# Altium footprint library PcbLibLafe.PcbLib: 294 footprints (part 11 of 19)
Each footprint in its own frame and in the unit in brackets; x right, y up, seen from the top. Pads: shape width x height; smd on the part's side, far side on the other; paste and mask are expansions set on the pad; w line width, h text height; cw(c..) or ccw(c..) is an arc to the next point about the centre after c.
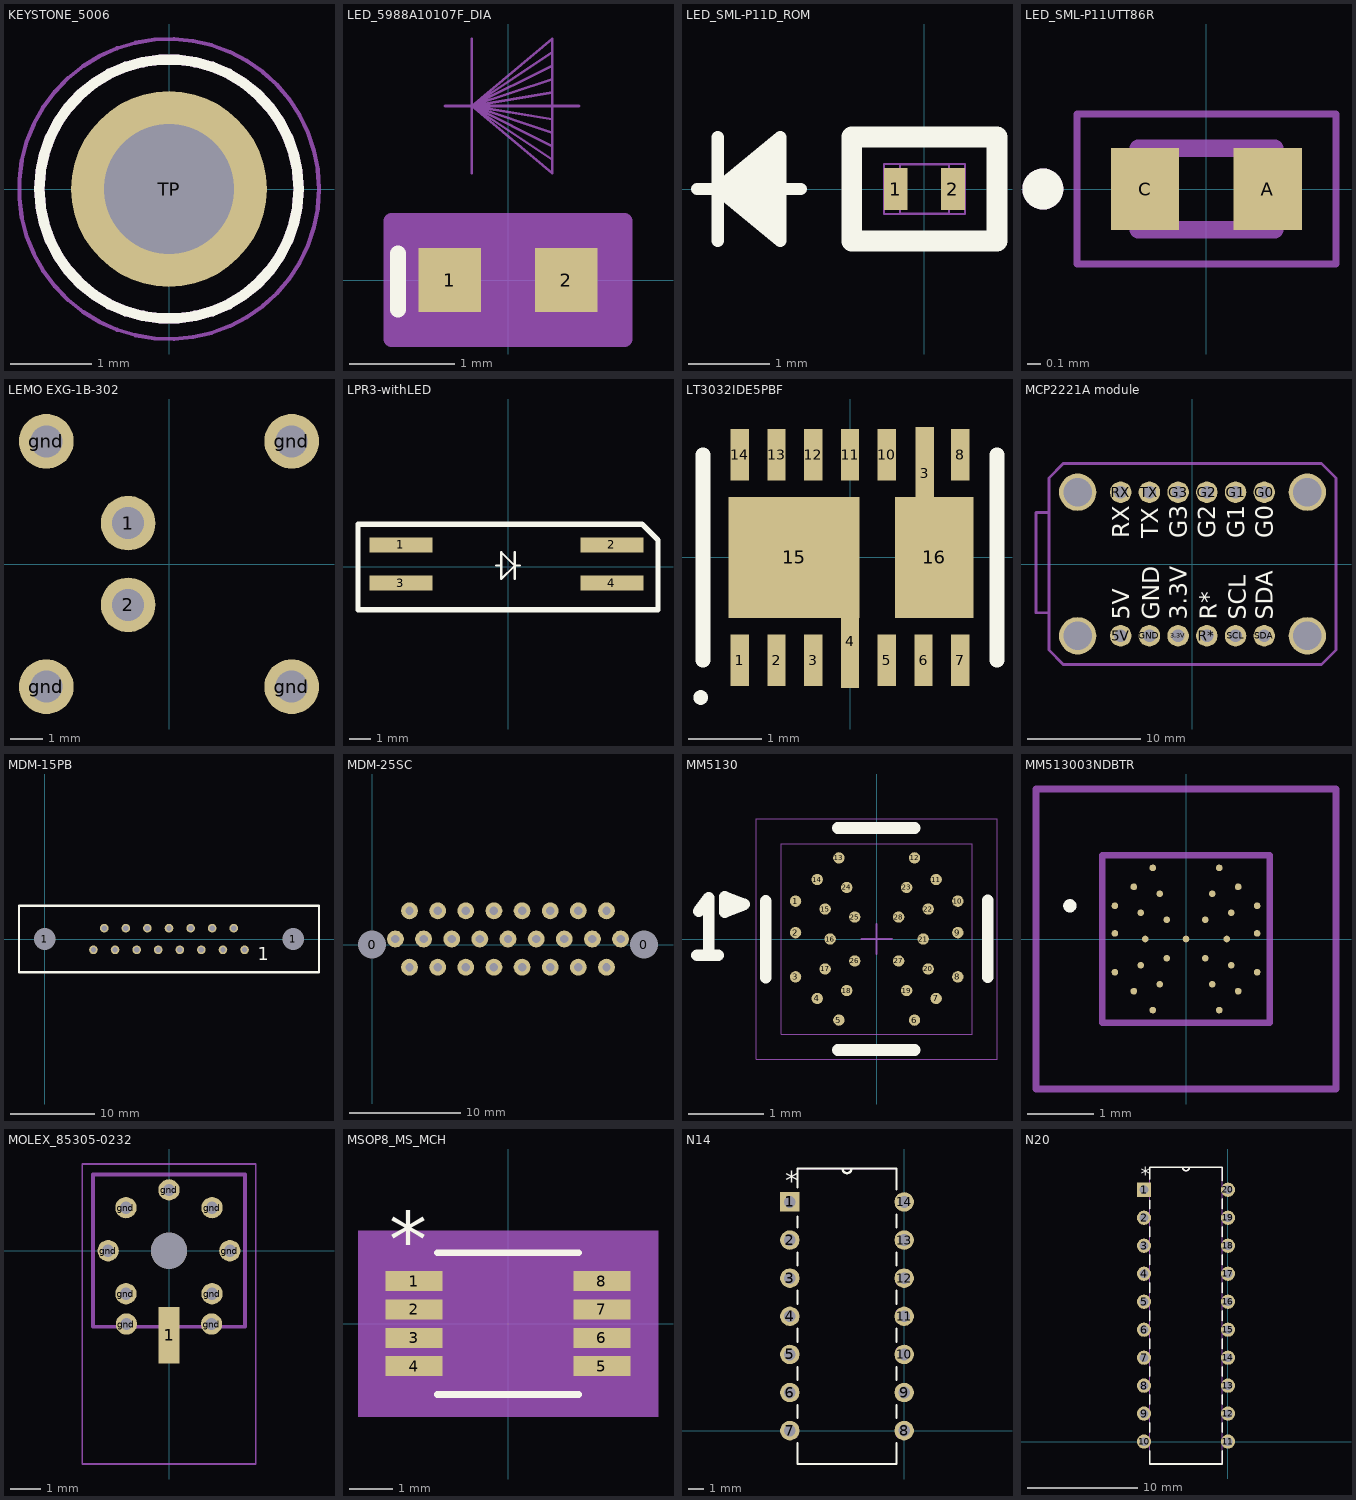
[diagram p10: the footprints below, top view; thin cyan lines are the x and y axes]

## KEYSTONE_5006 [mm]
pads (1):
  round 2.4 hole 1.6: TP(0,0)
Top Overlay:
  circle w0.127: c0,0 r1.59
Mechanical 13:
  circle w0.127: c0,0 r1.59
Mechanical 15:
  circle w0.05: c0,0 r1.84
3D body "step_temp.STEP": height 5.58, standoff -3.3, extent -1.576,-1.587 1.576,1.587

## LED_5988A10107F_DIA [mil]
pads (2):
  rect 23.5x24 smd paste+0 mask+0: 1(-21.75,0) 2(21.75,0)
Top Overlay:
  lines w6: -41,-11 -41,10
Mechanical 13:
  lines w1: -23.5,65 26.5,65 ; -13.5,40 -13.5,90 ; 16.5,45 -13.5,65 ; 16.5,50 -13.5,65 ; 16.5,55 -13.5,65 ; 16.5,60 -13.5,65 ; 16.5,70 -13.5,65 ; 16.5,75 -13.5,65 ; 16.5,80 -13.5,65 ; 16.5,85 -13.5,65 ; -13.5,65 16.5,40 16.5,90 -13.5,65 ; -19.5,-10 -19.5,10 19.5,10 19.5,-10 -19.5,-10
Mechanical 15:
  region: -29.5,-22 -43.5,-22 -43.5,22 -29.5,22 29.5,22 43.5,22 43.5,-22 29.5,-22
  lines w6: -43.5,-22 -29.5,-22 29.5,-22 43.5,-22 43.5,22 29.5,22 -29.5,22 -43.5,22 -43.5,-22
3D body "LED_5988A10107F_DIA.step": height 16.1, standoff -0.12, extent -19.49,-10.12 19.49,10.12

## LED_SML-P11D_ROM [mil]
pads (2):
  rect 11.5x20 smd paste+0 mask+0: 1(-13.75,0) 2(13.75,0)
Top Overlay:
  lines w6: -109.5,0 -59.5,0 ; -99.5,-25 -99.5,25 ; -69.5,-20 -99.5,0 ; -69.5,-15 -99.5,0 ; -69.5,-10 -99.5,0 ; -69.5,-5 -99.5,0 ; -69.5,5 -99.5,0 ; -69.5,10 -99.5,0 ; -69.5,15 -99.5,0 ; -69.5,20 -99.5,0 ; -99.5,0 -69.5,-25 -69.5,25 -99.5,0
  lines w10: -35,-25 35,-25 35,25 -35,25 -35,-25
Mechanical 13:
  lines w1: -109.5,0 -59.5,0 ; -99.5,-25 -99.5,25 ; -69.5,-20 -99.5,0 ; -69.5,-15 -99.5,0 ; -69.5,-10 -99.5,0 ; -69.5,-5 -99.5,0 ; -69.5,5 -99.5,0 ; -69.5,10 -99.5,0 ; -69.5,15 -99.5,0 ; -69.5,20 -99.5,0 ; -99.5,0 -69.5,-25 -69.5,25 -99.5,0 ; -19.5,-12 -19.5,12 19.5,12 19.5,-12 -19.5,-12 ; -11.81,-11.81 11.81,-11.81 11.81,11.81 -11.81,11.81 -11.81,-11.81
3D body: height 10, standoff 0, extent 0,0 10,10

## LED_SML-P11UTT86R [mm]
pads (2):
  rect 0.5x0.6 smd: A(0.45,0) C(-0.45,0)
Top Overlay:
  circle w0.2: c-1.2,0 r0.05
Mechanical 13:
  circle w0.2: c-1.2,0 r0.05
  lines w0.127: -0.5,-0.3 -0.5,0.3 0.5,0.3 0.5,-0.3 -0.5,-0.3
Mechanical 15:
  lines w0.05: -0.95,-0.55 -0.95,0.55 0.95,0.55 0.95,-0.55 -0.95,-0.55
3D body "step_temp.STEP": height 0.21, standoff -0.04, extent -0.5,-0.3 0.5,0.3

## LEMO EXG-1B-302 [mm] "2 pin LEMO right angle panel mount"
pads (6):
  round 1.7 hole 1: 1(-1.27,1.27) 2(-1.27,-1.27) gnd(-3.81,-3.81) gnd(-3.81,3.81) gnd(3.81,-3.81) gnd(3.81,3.81)

## LPR3-withLED [mil] "Bivar lightpipe integrated LED"
pads (4):
  rect 118x28 smd: 1(-200,41) 2(194,41) 3(-200,-30) 4(194,-30)
Top Overlay:
  lines w4: 12.5,-22.5 12.5,2.5 ; 12.5,27.5 12.5,2.5 ; 22.5,2.5 12.5,2.5 ; -12.5,2.5 -12.5,-22.5 12.5,2.5 ; -12.5,2.5 -22.5,2.5 -12.5,2.5 ; -12.5,2.5 -12.5,27.5 12.5,2.5
  lines w10: -280,-80 280,-80 280,50 250,80 -280,80 -280,-80

## LT3032IDE5PBF [mm]
pads (16):
  rect 0.25x0.7 smd: 1(-1.5,-1.4) 2(-1,-1.4) 3(-0.5,-1.4) 5(0.5,-1.4) 6(1,-1.4) 7(1.5,-1.4) 8(1.5,1.4) 10(0.5,1.4) 11(0,1.4) 12(-0.5,1.4) 13(-1,1.4) 14(-1.5,1.4)
  rect 0.25x1.27 smd: 3(1.016,1.143) 4(0,-1.143)
  rect 1.78x1.65 smd: 15(-0.762,0)
  rect 1.07x1.65 smd: 16(1.145,0)
Top Overlay:
  lines w0.1: -2.032,-1.955 ccw(c-2.032,-1.905) -2.032,-1.855 ccw(c-2.032,-1.905) -2.032,-1.955
  lines w0.2: -2,-1.4 -2,1.4 ; 2,-1.4 2,1.4
3D body "LT3032IDE-5#PBF.stp": height 0.9, standoff 0, extent -2,-1.5 2,1.5

## MCP2221A module [mil] "Adafruit MCP2221A"
pads (16):
  round 75 hole 45: 3.3V(-50,-250) 5V(-250,-250) G0(250,250) G1(150,250) G2(50,250) G3(-50,250) GND(-150,-250) R*(50,-250) RX(-250,250) SCL(150,-250) SDA(250,-250) TX(-150,250)
  round 130 hole 100: ""(-400,-250) ""(-400,250) ""(400,-250) ""(400,250)
Top Overlay:
  text "SDA" at 280,-195 h60
  text "SCL" at 185,-195 h60
  text "R*" at 85,-195 h60
  text "3.3V" at -20,-195 h60
  text "GND" at -115,-195 h60
  text "5V" at -220,-195 h60
  text "G0" at 280,90 h60
  text "G1" at 180,90 h60
  text "G2" at 80,90 h60
  text "G3" at -20,90 h60
  text "TX" at -120,90 h60
  text "RX" at -220,90 h60
Mechanical 2:
  lines w10: -500,-170 -545,-170 -545,180 -500,180 ; -500,-300 -500,300 -450,350 450,350 500,300 500,-300 450,-350 -450,-350 -500,-300

## MDM-15PB [mil] "MicroD-15 pin"
pads (17):
  round 60 hole 100: 1(0,0) 1(1150,0)
  round 40 hole 25: ""(225,-50) ""(275,50) ""(325,-50) ""(375,50) ""(425,-50) ""(475,50) ""(525,-50) ""(575,50) ""(625,-50) ""(675,50) ""(725,-50) ""(775,50) ""(825,-50) ""(875,50) ""(925,-50)
Top Overlay:
  lines w10: -120,-154 1270,-154 1270,154 -120,154 -120,-154
  text "1" at 987,-98 h60

## MDM-25SC [mil] "MicroD 25 pin female socket"
pads (27):
  round 60 hole 100: 0(0,0) 0(966,0)
  round 60 hole 30: ""(83,20) ""(133,-80) ""(133,120) ""(183,20) ""(233,-80) ""(233,120) ""(283,20) ""(333,-80) ""(333,120) ""(383,20) ""(433,-80) ""(433,120) ""(483,20) ""(533,-80) ""(533,120) ""(583,20) ""(633,-80) ""(633,120) ""(683,20) ""(733,-80) ""(733,120) ""(783,20) ""(833,-80) ""(833,120) ""(883,20)

## MM5130 [mm] "Standard MM5130 Footprint"
height 1
pads (28):
  round 0.15 smd paste+0 mask+0.025: 1(-1.072,0.5) 2(-1.072,0.084) 3(-1.072,-0.5) 4(-0.786,-0.786) 5(-0.5,-1.072) 6(0.5,-1.072) 7(0.786,-0.786) 8(1.072,-0.5) 9(1.072,0.084) 10(1.072,0.5) 11(0.786,0.786) 12(0.5,1.072) 13(-0.5,1.072) 14(-0.786,0.786) 15(-0.681,0.396) 16(-0.615,0) 17(-0.681,-0.396) 18(-0.396,-0.681) 19(0.396,-0.681) 20(0.681,-0.396) 21(0.615,0) 22(0.681,0.396) 23(0.396,0.681) 24(-0.396,0.681) 25(-0.29,0.29) 26(-0.29,-0.29) 27(0.29,-0.29) 28(0.29,0.29)
Top Overlay:
  lines w0.152: -2.349,0.368 -2.222,0.546 -2.222,-0.216 -2.375,-0.216 -2.095,-0.216 ; -1.467,-0.514 -1.467,0.502 ; -0.514,-1.467 0.502,-1.467 ; -0.514,1.467 0.502,1.467 ; 1.467,-0.504 1.467,0.512 ; -2.007,0.356 -1.753,0.457 -2.007,0.559 -2.007,0.356
Top Courtyard:
  lines w0.01: -1.59,-1.59 1.59,-1.59 1.59,1.59 -1.59,1.59 -1.59,-1.59
Top Component Center:
  lines w0.025: -0.2,0 0.2,0 ; 0,-0.2 0,0.2
Mechanical 16:
  text "G1" at -1.16,0.162 h0.07
  text "RF1" at -0.881,0.858 h0.07
  text "G2" at -0.709,0.091 h0.07
  text "G3" at 0.764,0.097 h0.07
  text "RF4" at 0.93,0.859 h0.07
  text "G4" at 1.205,0.186 h0.07
  text "RF2" at -0.855,-1.065 h0.07
  text "RFC" at 0.027,-0.303 h0.07
  text "RF3" at 0.954,-1.016 h0.07
Top Component Outline:
  lines w0.01: -1.26,-1.26 1.26,-1.26 1.26,1.26 -1.26,1.26 -1.26,-1.26
3D body "MM5130.STEP": height 0.94, standoff 0, extent -1.26,-1.26 1.26,1.26

## MM513003NDBTR [mm]
pads (29):
  round 0.1 smd: 1(-1.072,0.5) 2(-1.072,0.084) 3(-1.072,-0.5) 4(-0.786,-0.786) 5(-0.5,-1.072) 6(0.5,-1.072) 7(0.786,-0.786) 8(1.072,-0.5) 9(1.072,0.084) 10(1.072,0.5) 11(0.786,0.786) 12(0.5,1.072) 13(-0.5,1.072) 14(-0.786,0.786) 15(-0.681,0.396) 16(-0.615,0) 17(-0.681,-0.396) 18(-0.396,-0.681) 19(0.396,-0.681) 20(0.681,-0.396) 21(0.615,0) 22(0.681,0.396) 23(0.396,0.681) 24(-0.396,0.681) 25(-0.29,0.29) 26(-0.29,-0.29) 27(0.29,-0.29) 28(0.29,0.29) 29(0,0)
Top Overlay:
  lines w0.1: -1.8,0.5 cw(c-1.75,0.5) -1.7,0.5 cw(c-1.75,0.5) -1.8,0.5
Mechanical 15:
  lines w0.1: -1.26,-1.26 -1.26,1.26 1.26,1.26 1.26,-1.26 -1.26,-1.26
Mechanical 20:
  lines w0.1: -2.26,-2.26 -2.26,2.26 2.26,2.26 2.26,-2.26 -2.26,-2.26
3D body "MM5130-03NDB-TR.stp": height 0.94, standoff 0, extent -1.26,-1.26 1.26,1.26

## MOLEX_85305-0232 [mm]
height 4.1
pads (11):
  rect 0.7x1.85 smd: 1(0,-2.775)
  round 0.7 hole 0.4 mask+0: gnd(-2,0) gnd(-1.414,-1.414) gnd(-1.414,1.414) gnd(-1.4,-2.41) gnd(0,2) gnd(1.4,-2.41) gnd(1.414,-1.414) gnd(1.414,1.414) gnd(2,0)
  round 1.19 hole 1.19 unplated: ""(0,0)
Top Paste:
  region: 2.6,-2.6 0.725,-2.6 0.725,-1.198 0.917,-1.058 1.086,-0.884 1.222,-0.683 1.322,-0.462 1.381,-0.227 1.4,0.015 1.376,0.256 1.312,0.49 1.208,0.708 1.067,0.906 0.895,1.077 0.696,1.215 0.476,1.317 0.242,1.379 0,1.4 -0.242,1.379 -0.476,1.317 -0.696,1.215 -0.895,1.077 -1.067,0.906 -1.208,0.708 -1.312,0.49 -1.376,0.256 -1.4,0.015 -1.381,-0.227 -1.322,-0.462 -1.222,-0.683 -1.086,-0.884 -0.917,-1.058 -0.725,-1.198 -0.725,-2.6 -2.6,-2.6 -2.6,2.6 2.6,2.6
Top Solder:
  region: 2.6,-2.6 0.725,-2.6 0.725,-1.198 0.917,-1.058 1.086,-0.884 1.222,-0.683 1.322,-0.462 1.381,-0.227 1.4,0.015 1.376,0.256 1.312,0.49 1.208,0.708 1.067,0.906 0.895,1.077 0.696,1.215 0.476,1.317 0.242,1.379 0,1.4 -0.242,1.379 -0.476,1.317 -0.696,1.215 -0.895,1.077 -1.067,0.906 -1.208,0.708 -1.312,0.49 -1.376,0.256 -1.4,0.015 -1.381,-0.227 -1.322,-0.462 -1.222,-0.683 -1.086,-0.884 -0.917,-1.058 -0.725,-1.198 -0.725,-2.6 -2.6,-2.6 -2.6,2.6 2.6,2.6
Mechanical 13:
  lines w0.127: -2.5,-2.5 2.5,-2.5 2.5,2.5 -2.5,2.5 -2.5,-2.5
Mechanical 15:
  lines w0.05: -2.85,-7.01 -2.85,2.85 2.85,2.85 2.85,-7.01 -2.85,-7.01
3D body "853050232.stp": height 4.06, standoff -0.04, extent -2.5,-3.499 2.5,2.5

## MSOP8_MS_MCH [mil]
pads (8):
  rect 51.5x18 smd paste+0 mask+0: 1(-84.75,38.39) 2(-84.75,12.8) 3(-84.75,-12.8) 4(-84.75,-38.39) 5(84.75,-38.39) 6(84.75,-12.8) 7(84.75,12.8) 8(84.75,38.39)
Top Overlay:
  lines w6: -64,-64 64,-64 ; -64,64 64,64
  text "*" at -107.25,51.39 h50
Mechanical 5:
  region: 135.5,-84 -135.5,-84 -135.5,84 135.5,84
Mechanical 13:
  lines w0: -12,59 ccw(c0,59) 12,59
  lines w1: -96.5,-46.39 -59,-46.39 -59,-30.39 -96.5,-30.39 -96.5,-46.39 ; -96.5,-20.8 -59,-20.8 -59,-4.8 -96.5,-4.8 -96.5,-20.8 ; -96.5,4.8 -59,4.8 -59,20.8 -96.5,20.8 -96.5,4.8 ; -96.5,30.39 -59,30.39 -59,46.39 -96.5,46.39 -96.5,30.39 ; -59,-59 -59,59 59,59 59,-59 -59,-59 ; 59,-46.39 96.5,-46.39 96.5,-30.39 59,-30.39 59,-46.39 ; 59,-20.8 96.5,-20.8 96.5,-4.8 59,-4.8 59,-20.8 ; 59,4.8 96.5,4.8 96.5,20.8 59,20.8 59,4.8 ; 59,30.39 96.5,30.39 96.5,46.39 59,46.39 59,30.39
  text "*" at -56.5,6 h50
Mechanical 15:
  region: -69,-57.39 -120.5,-57.39 -120.5,57.39 -69,57.39 -69,69 69,69 69,57.39 120.5,57.39 120.5,-57.39 69,-57.39 69,-69 -69,-69
  lines w6: -120.5,-57.39 -69,-57.39 -69,-69 69,-69 69,-57.39 120.5,-57.39 120.5,57.39 69,57.39 69,69 -69,69 -69,57.39 -120.5,57.39 -120.5,-57.39
3D body "MSOP8_MS_MCH.step": height 43.11, standoff 0, extent -96.5,-59.02 96.5,59.02

## N14 [mil]
pads (14):
  rect 51x51 hole 31: 1(-300,600)
  round 51 hole 31: 2(-300,500) 3(-300,400) 4(-300,300) 5(-300,200) 6(-300,100) 7(-300,0) 8(0,0) 9(0,100) 10(0,200) 11(0,300) 12(0,400) 13(0,500) 14(0,600)
Top Overlay:
  lines w6: -280,-33.01 -280,-87.5 -20,-87.5 -20,-33.01 ; -280,33.01 -280,66.99 ; -280,133.01 -280,166.99 ; -280,233.01 -280,266.99 ; -280,333.01 -280,366.99 ; -280,433.01 -280,466.99 ; -280,533.01 -280,561.4 ; -280,638.6 -280,687.5 -20,687.5 -20,633.01 ; -162,687.5 ccw(c-150,687.5) -138,687.5 ; -20,33.01 -20,66.99 ; -20,133.01 -20,166.99 ; -20,233.01 -20,266.99 ; -20,333.01 -20,366.99 ; -20,433.01 -20,466.99 ; -20,533.01 -20,566.99
  text "*" at -312.5,630.5 h50
Mechanical 13:
  lines w0: -162,687.5 ccw(c-150,687.5) -138,687.5
  lines w1: -315.5,-15.5 -280,-15.5 -280,15.5 -315.5,15.5 ; -315.5,84.5 -280,84.5 -280,115.5 -315.5,115.5 ; -315.5,184.5 -280,184.5 -280,215.5 -315.5,215.5 ; -315.5,284.5 -280,284.5 -280,315.5 -315.5,315.5 ; -315.5,384.5 -280,384.5 -280,415.5 -315.5,415.5 ; -315.5,484.5 -280,484.5 -280,515.5 -315.5,515.5 ; -315.5,584.5 -280,584.5 -280,615.5 -315.5,615.5 ; -280,-87.5 -20,-87.5 ; -280,687.5 -20,687.5 ; -20,-15.5 -20,15.5 ; -20,84.5 -20,115.5 ; -20,184.5 -20,215.5 ; -20,284.5 -20,315.5 ; -20,384.5 -20,415.5 ; -20,484.5 -20,515.5 ; -20,584.5 -20,615.5
  text "*" at -312.5,630.5 h50
3D body "N0014A.stp": height 184, standoff -145.5, extent -308.54,-89.57 1.46,685.43

## N20 [mil]
pads (20):
  rect 51x51 hole 31: 1(-300,900)
  round 51 hole 31: 2(-300,800) 3(-300,700) 4(-300,600) 5(-300,500) 6(-300,400) 7(-300,300) 8(-300,200) 9(-300,100) 10(-300,0) 11(0,0) 12(0,100) 13(0,200) 14(0,300) 15(0,400) 16(0,500) 17(0,600) 18(0,700) 19(0,800) 20(0,900)
Top Overlay:
  lines w6: -280,-33.01 -280,-80 -20,-80 -20,-33.01 ; -280,33.01 -280,66.99 ; -280,133.01 -280,166.99 ; -280,233.01 -280,266.99 ; -280,333.01 -280,366.99 ; -280,433.01 -280,466.99 ; -280,533.01 -280,566.99 ; -280,633.01 -280,666.99 ; -280,733.01 -280,766.99 ; -280,833.01 -280,861.4 ; -280,938.6 -280,980 -20,980 -20,933.01 ; -162,980 ccw(c-150,980) -138,980 ; -20,33.01 -20,66.99 ; -20,133.01 -20,166.99 ; -20,233.01 -20,266.99 ; -20,333.01 -20,366.99 ; -20,433.01 -20,466.99 ; -20,533.01 -20,566.99 ; -20,633.01 -20,666.99 ; -20,733.01 -20,766.99 ; -20,833.01 -20,866.99
  text "*" at -312.5,930.5 h50
Mechanical 13:
  lines w0: -162,980 ccw(c-150,980) -138,980
  lines w1: -315.5,-15.5 -280,-15.5 -280,15.5 -315.5,15.5 -315.5,-15.5 ; -315.5,84.5 -280,84.5 -280,115.5 -315.5,115.5 -315.5,84.5 ; -315.5,184.5 -280,184.5 -280,215.5 -315.5,215.5 -315.5,184.5 ; -315.5,284.5 -280,284.5 -280,315.5 -315.5,315.5 -315.5,284.5 ; -315.5,384.5 -280,384.5 -280,415.5 -315.5,415.5 -315.5,384.5 ; -315.5,484.5 -280,484.5 -280,515.5 -315.5,515.5 -315.5,484.5 ; -315.5,584.5 -280,584.5 -280,615.5 -315.5,615.5 -315.5,584.5 ; -315.5,684.5 -280,684.5 -280,715.5 -315.5,715.5 -315.5,684.5 ; -315.5,784.5 -280,784.5 -280,815.5 -315.5,815.5 -315.5,784.5 ; -315.5,884.5 -280,884.5 -280,915.5 -315.5,915.5 -315.5,884.5 ; -280,-80 -280,980 -20,980 -20,-80 -280,-80 ; -20,-15.5 15.5,-15.5 15.5,15.5 -20,15.5 -20,-15.5 ; -20,84.5 15.5,84.5 15.5,115.5 -20,115.5 -20,84.5 ; -20,184.5 15.5,184.5 15.5,215.5 -20,215.5 -20,184.5 ; -20,284.5 15.5,284.5 15.5,315.5 -20,315.5 -20,284.5 ; -20,384.5 15.5,384.5 15.5,415.5 -20,415.5 -20,384.5 ; -20,484.5 15.5,484.5 15.5,515.5 -20,515.5 -20,484.5 ; -20,584.5 15.5,584.5 15.5,615.5 -20,615.5 -20,584.5 ; -20,684.5 15.5,684.5 15.5,715.5 -20,715.5 -20,684.5 ; -20,784.5 15.5,784.5 15.5,815.5 -20,815.5 -20,784.5 ; -20,884.5 15.5,884.5 15.5,915.5 -20,915.5 -20,884.5
  text "*" at -312.5,930.5 h50
3D body "N0020A.stp": height 159, standoff -170.5, extent -306.57,-75.79 3.42,984.21
3D body: height 10, standoff 0, extent 0,0 10,10